# Altium footprint library lib_datalogger.PcbLib: 866 footprints (part 2 of 55)
Each footprint in its own frame and in the unit in brackets; x right, y up, seen from the top. Pads: shape width x height; smd on the part's side, far side on the other; paste and mask are expansions set on the pad; w line width, h text height; cw(c..) or ccw(c..) is an arc to the next point about the centre after c.
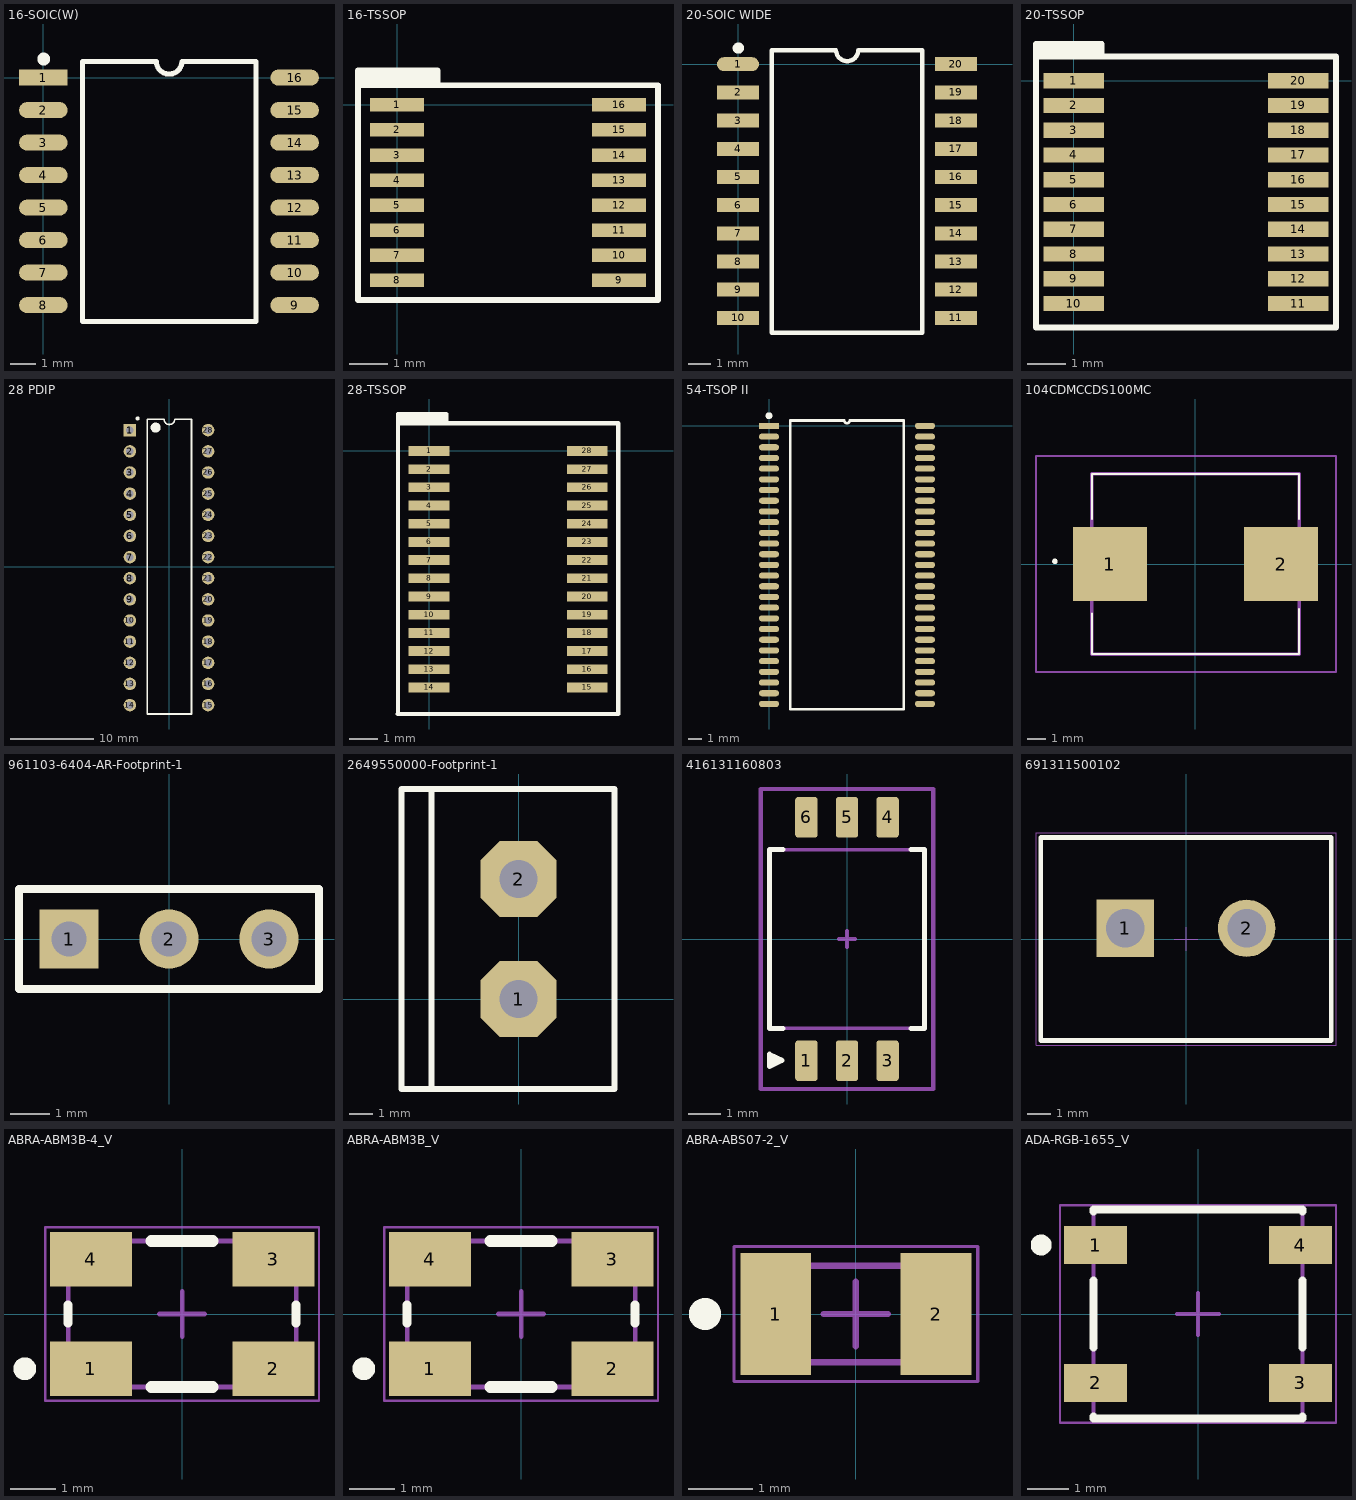
[diagram p1: the footprints below, top view; thin cyan lines are the x and y axes]

## 16-SOIC(W) [mm]
pads (16):
  rect 1.9x0.63 smd mask+0.076: 1(0,0)
  oval 1.9x0.63 smd mask+0.076: 2(0,-1.27) 3(0,-2.54) 4(0,-3.81) 5(0,-5.08) 6(0,-6.35) 7(0,-7.62) 8(0,-8.89) 9(9.82,-8.89) 10(9.82,-7.62) 11(9.82,-6.35) 12(9.82,-5.08) 13(9.82,-3.81) 14(9.82,-2.54) 15(9.82,-1.27) 16(9.82,0)
Top Overlay:
  circle w0.254: c0.015,0.724 r0.125
  lines w0.2: 1.524,-9.525 1.524,0.635 4.415,0.635 ccw(c4.915,0.635) 5.415,0.635 8.306,0.635 8.306,-9.525 1.524,-9.525
3D body "soic16w.step": height 1.7, standoff 0, extent -0.411,-9.398 10.231,0.508

## 16-TSSOP [mm]
pads (16):
  rect 1.4x0.35 smd: 1(0,0) 2(0,-0.65) 3(0,-1.3) 4(0,-1.95) 5(0,-2.6) 6(0,-3.25) 7(0,-3.9) 8(0,-4.55) 9(5.75,-4.55) 10(5.75,-3.9) 11(5.75,-3.25) 12(5.75,-2.6) 13(5.75,-1.95) 14(5.75,-1.3) 15(5.75,-0.65) 16(5.75,0)
Top Overlay:
  region: 1.041,0.508 1.041,0.889 -1.016,0.889 -1.016,0.508
  lines w0.152: -1.016,0.508 6.756,0.508 6.756,-5.055 -1.016,-5.055 -1.016,0.889 1.041,0.889 1.041,0.508
3D body "TSSOP-16-1.step": height 1.1, standoff 0, extent -0.33,-4.775 6.07,0.225

## 20-SOIC WIDE [mm]
pads (20):
  oval 1.9x0.63 smd mask+0.076: 1(0,0)
  rect 1.9x0.63 smd mask+0.076: 2(0,-1.27) 3(0,-2.54) 4(0,-3.81) 5(0,-5.08) 6(0,-6.35) 7(0,-7.62) 8(0,-8.89) 9(0,-10.16) 10(0,-11.43) 11(9.82,-11.43) 12(9.82,-10.16) 13(9.82,-8.89) 14(9.82,-7.62) 15(9.82,-6.35) 16(9.82,-5.08) 17(9.82,-3.81) 18(9.82,-2.54) 19(9.82,-1.27) 20(9.82,0)
Top Overlay:
  circle w0.254: c0.015,0.724 r0.125
  lines w0.2: 1.524,-12.09 1.524,0.635 4.415,0.635 ccw(c4.915,0.635) 5.415,0.635 8.306,0.635 8.306,-12.09 1.524,-12.09
3D body "20-SOIC-W.step": height 1.7, standoff 0, extent -0.406,-11.938 10.236,0.508

## 20-TSSOP [mm]
pads (20):
  rect 1.6x0.4 smd: 1(0,0) 2(0,-0.65) 3(0,-1.3) 4(0,-1.95) 5(0,-2.6) 6(0,-3.25) 7(0,-3.9) 8(0,-4.55) 9(0,-5.2) 10(0,-5.85) 11(5.893,-5.85) 12(5.893,-5.2) 13(5.893,-4.55) 14(5.893,-3.9) 15(5.893,-3.25) 16(5.893,-2.6) 17(5.893,-1.95) 18(5.893,-1.3) 19(5.893,-0.65) 20(5.893,0)
Top Overlay:
  region: -0.991,0.965 -0.991,0.635 0.737,0.635 0.737,0.965
  lines w0.152: 0.737,0.635 0.737,0.965 -0.991,0.965 -0.991,0.635 ; -0.991,0.635 -0.991,-6.477 6.883,-6.477 6.883,0.635 -0.991,0.635
3D body "tssop-20-1.step": height 1.2, standoff 0, extent -0.354,-6.221 6.246,0.379

## 28 PDIP [mm]
pads (28):
  rect 1.5x1.5 hole 0.9: 1(-4.699,16.383)
  round 1.5 hole 0.9: 2(-4.699,13.843) 3(-4.699,11.303) 4(-4.699,8.763) 5(-4.699,6.223) 6(-4.699,3.683) 7(-4.699,1.143) 8(-4.699,-1.397) 9(-4.699,-3.937) 10(-4.699,-6.477) 11(-4.699,-9.017) 12(-4.699,-11.557) 13(-4.699,-14.097) 14(-4.699,-16.637) 15(4.699,-16.637) 16(4.699,-14.097) 17(4.699,-11.557) 18(4.699,-9.017) 19(4.699,-6.477) 20(4.699,-3.937) 21(4.699,-1.397) 22(4.699,1.143) 23(4.699,3.683) 24(4.699,6.223) 25(4.699,8.763) 26(4.699,11.303) 27(4.699,13.843) 28(4.699,16.383)
Top Overlay:
  circle w0.6: c-1.605,16.692 r0.3
  circle w0.25: c-3.765,17.802 r0.125
  lines w0.2: -2.605,-17.708 2.695,-17.708 2.695,17.692 0.68,17.692 cw(c0.045,17.692) -0.59,17.692 -2.605,17.692 -2.605,-17.708
3D body "ATmega 48_88_168 28P3.STEP": height 5.54, standoff -1.59, extent -4.88,-17.526 4.88,17.124

## 28-TSSOP [mm]
pads (28):
  rect 1.45x0.35 smd: 1(0,0) 2(0,-0.65) 3(0,-1.3) 4(0,-1.95) 5(0,-2.6) 6(0,-3.25) 7(0,-3.9) 8(0,-4.55) 9(0,-5.2) 10(0,-5.85) 11(0,-6.5) 12(0,-7.15) 13(0,-7.8) 14(0,-8.45) 15(5.65,-8.45) 16(5.65,-7.8) 17(5.65,-7.15) 18(5.65,-6.5) 19(5.65,-5.85) 20(5.65,-5.2) 21(5.65,-4.55) 22(5.65,-3.9) 23(5.65,-3.25) 24(5.65,-2.6) 25(5.65,-1.95) 26(5.65,-1.3) 27(5.65,-0.65) 28(5.65,0)
Top Overlay:
  region: -1.112,1.321 -1.112,0.991 0.615,0.991 0.615,1.321
  lines w0.152: -1.118,-9.398 6.756,-9.398 ; -1.112,-9.398 -1.112,0.991 ; 0.615,0.991 0.615,1.321 -1.112,1.321 -1.112,0.991 ; 6.756,0.991 -1.112,0.991 ; 6.762,-9.398 6.762,0.991
3D body "tssop28.step": height 1.2, standoff 0, extent -0.375,-9.142 6.025,0.658

## 54-TSOP II [mm]
pads (54):
  rect 1.51x0.458 smd: 1(0,0)
  oval 1.51x0.458 smd: 2(0,-0.8) 3(0,-1.6) 4(0,-2.4) 5(0,-3.2) 6(0,-4) 7(0,-4.8) 8(0,-5.6) 9(0,-6.4) 10(0,-7.2) 11(0,-8) 12(0,-8.8) 13(0,-9.6) 14(0,-10.4) 15(0,-11.2) 16(0,-12) 17(0,-12.8) 18(0,-13.6) 19(0,-14.4) 20(0,-15.2) 21(0,-16) 22(0,-16.8) 23(0,-17.6) 24(0,-18.4) 25(0,-19.2) 26(0,-20) 27(0,-20.8) 28(11.67,-20.8) 29(11.67,-20) 30(11.67,-19.2) 31(11.67,-18.4) 32(11.67,-17.6) 33(11.67,-16.8) 34(11.67,-16) 35(11.67,-15.2) 36(11.67,-14.4) 37(11.67,-13.6) 38(11.67,-12.8) 39(11.67,-12) 40(11.67,-11.2) 41(11.67,-10.4) 42(11.67,-9.6) 43(11.67,-8.8) 44(11.67,-8) 45(11.67,-7.2) 46(11.67,-6.4) 47(11.67,-5.6) 48(11.67,-4.8) 49(11.67,-4) 50(11.67,-3.2) 51(11.67,-2.4) 52(11.67,-1.6) 53(11.67,-0.8) 54(11.67,0)
Top Overlay:
  circle w0.254: c0,0.762 r0.13
  lines w0.2: 1.59,-21.2 10.08,-21.2 10.08,0.4 6.035,0.4 cw(c5.835,0.4) 5.635,0.4 1.59,0.4 1.59,-21.2
3D body "TSOP-54-1.step": height 1.25, standoff 0, extent -0.045,-21.51 11.715,0.71

## 104CDMCCDS100MC [mm]
pads (2):
  rect 4.1x4.1 smd: 1(-4.75,0) 2(4.75,0)
Top Overlay:
  lines w0.1: -5.75,-5 -5.75,-2.75 -5.75,-5 ; -5.75,-5 5.75,-5 ; -5.75,-5 5.75,-5 ; -5.75,5 5.75,5 ; -5.75,5 5.75,5 ; -5.75,5 -5.75,2.5 -5.75,5 ; 5.75,-5 5.75,-2.5 5.75,-5 ; 5.75,5 5.75,2.5 5.75,5
  lines w0.2: -7.8,0.1 cw(c-7.8,0.15) -7.8,0.2 ; -7.8,0.1 ccw(c-7.8,0.15) -7.8,0.2 ; -7.8,0.1 cw(c-7.8,0.15) -7.8,0.2
Mechanical 13:
  lines w0.2: -5.75,-5 -5.75,5 5.75,5 5.75,-5 -5.75,-5
Mechanical 15:
  lines w0.1: -8.85,-6 -8.85,6 7.8,6 7.8,-6 -8.85,-6
3D body "104CDMCCDS-100MC.stp": height 4.1, standoff 0, extent -6.39,-5 6.39,5

## 961103-6404-AR-Footprint-1 [mm]
pads (3):
  rect 1.5x1.5 hole 0.9: 1(-2.54,0)
  round 1.5 hole 0.9: 2(0,0) 3(2.54,0)
Top Overlay:
  lines w0.2: -3.81,-1.27 -3.81,1.27 3.81,1.27 3.81,-1.27 -3.81,-1.27
3D body "User Library-Header_Male_3Pin.STEP": height 8.54, standoff -3, extent -3.81,-1.245 3.81,1.245

## 2649550000-Footprint-1 [mil]
pads (2):
  oct 126x126 hole 63: 1(0,0) 2(0,200)
Top Overlay:
  lines w10: -145,-150 -145,350 ; -195,-150 -195,350 160,350 160,-150 -195,-150
3D body "1924305.stp": height 472.44, standoff -153.54, extent -188.58,-139.37 150,339.37

## 416131160803 [mm] "03p, 1.27mm Pitch, Horizontal, HP Type, SMT, flat Actuator, black, with Tape, T&R"
height 3.3
pads (6):
  rrect25% 0.7x1.27 smd: 1(-1.27,-3.81) 2(0,-3.81) 3(1.27,-3.81) 4(1.27,3.81) 5(0,3.81) 6(-1.27,3.81)
Top Overlay:
  region: -2.025,-3.8 -2.425,-3.6 -2.425,-4
  region: -2.005,-3.8
  region: -2.005,-3.8
  lines w0.15: -2,-2.8 -2.425,-2.8 -2.425,2.8 -2,2.8 ; 2,-2.8 2.425,-2.8 2.425,2.8 2,2.8 ; -2.425,-4 -2.425,-3.6 -2.025,-3.8 -2.425,-4
Mechanical 13:
  lines w0.1: -2.413,-2.794 2.413,-2.794 2.413,2.794 -2.413,2.794 -2.413,-2.794
Mechanical 15:
  lines w0.127: -0.254,0 0.254,0 ; 0,-0.254 0,0.254 ; -2.7,-4.695 -2.7,4.695 2.7,4.695 2.7,-4.695 -2.7,-4.695
Top Designator:
  text ".Designator" at -1.27,-0.127 h0.6
3D body "416131160803.stp": height 2.06, standoff -0.04, extent -2.425,-4 2.425,4

## 691311500102 [mm] "5,08mm - PCB Headers - Vertical - Closed ends -02p"
height 12
pads (2):
  rect 2.4x2.4 hole 1.6: 1(-2.54,0.45)
  round 2.4 hole 1.6: 2(2.54,0.45)
Top Overlay:
  lines w0.2: -6.08,-4.25 -6.08,4.25 6.08,4.25 6.08,-4.25 -6.08,-4.25
Mechanical 13:
  lines w0.1: -6.08,-4.25 6.08,-4.25 6.08,4.25 -6.08,4.25 -6.08,-4.25
Mechanical 15:
  lines w0.05: -0.5,0 0.5,0 ; 0,-0.5 0,0.5 ; -6.28,-4.45 -6.28,4.45 6.28,4.45 6.28,-4.45 -6.28,-4.45
3D body "691311500102.stp": height 12.05, standoff -3.95, extent -6.08,-4.25 6.08,4.25

## ABRA-ABM3B-4_V [mm] "SMD, 4-Leads, Body 5x3.2mm"
height 1.1
pads (4):
  rect 1.8x1.2 smd: 1(-2,-1.2) 2(2,-1.2) 3(2,1.2) 4(-2,1.2)
Top Overlay:
  circle w0.25: c-3.45,-1.2 r0.125
  lines w0.2: -2.5,-0.2 -2.5,0.2 ; 2.5,-0.2 2.5,0.2
  lines w0.254: -0.673,-1.6 0.673,-1.6 ; -0.673,1.6 0.673,1.6
Mechanical 13:
  lines w0.1: -2.5,-1.6 -2.5,1.6 2.5,1.6 2.5,-1.6 -2.5,-1.6
Mechanical 15:
  lines w0.05: -3,-1.9 3,-1.9 3,1.9 -3,1.9 -3,-1.9
  lines w0.1: -0.5,0 0.5,0 ; 0,-0.5 0,0.5
3D body "ABM3B.STEP": height 1.13, standoff 0.01, extent -2.5,-1.587 2.5,1.588

## ABRA-ABM3B_V [mm] "SMD, 4-Leads, Body 5x3.2mm"
height 1.1
pads (4):
  rect 1.8x1.2 smd: 1(-2,-1.2) 2(2,-1.2) 3(2,1.2) 4(-2,1.2)
Top Overlay:
  circle w0.25: c-3.45,-1.2 r0.125
  lines w0.2: -2.5,-0.2 -2.5,0.2 ; 2.5,-0.2 2.5,0.2
  lines w0.254: -0.673,-1.6 0.673,-1.6 ; -0.673,1.6 0.673,1.6
Mechanical 13:
  lines w0.1: -2.5,-1.6 2.5,-1.6 2.5,1.6 -2.5,1.6 -2.5,-1.6
Mechanical 15:
  lines w0.05: -3,-1.9 -3,1.9 3,1.9 3,-1.9 -3,-1.9
  lines w0.1: -0.5,0 0.5,0 ; 0,-0.5 0,0.5
3D body "ABM3B.STEP": height 1.13, standoff 0.01, extent -2.5,-1.587 2.5,1.588

## ABRA-ABS07-2_V [mm] "SMD, 2-Leads, Body 3.2x1.5mm"
height 0.9
pads (2):
  rect 1.1x1.9 smd: 1(-1.25,0) 2(1.25,0)
Top Overlay:
  circle w0.25: c-2.35,0 r0.125
Mechanical 13:
  lines w0.1: -1.6,-0.75 -1.6,0.75 1.6,0.75 1.6,-0.75 -1.6,-0.75
Mechanical 15:
  lines w0.05: -1.9,-1.05 -1.9,1.05 1.9,1.05 1.9,-1.05 -1.9,-1.05
  lines w0.1: -0.5,0 0.5,0 ; 0,-0.5 0,0.5
3D body "ABS07.STEP": height 0.9, standoff 0.01, extent -1.6,-0.749 1.6,0.749

## ADA-RGB-1655_V [mm] "SMD, 4-Leads, Body 5x5mm"
pads (4):
  rect 1.5x0.9 smd: 1(-2.45,1.65) 2(-2.45,-1.65) 3(2.45,-1.65) 4(2.45,1.65)
Top Overlay:
  circle w0.25: c-3.75,1.65 r0.125
  lines w0.2: -2.5,-2.45 -2.5,-2.5 2.5,-2.5 2.5,-2.45 ; -2.5,-0.8 -2.5,0.8 ; -2.5,2.45 -2.5,2.5 2.5,2.5 2.5,2.45 ; 2.5,-0.8 2.5,0.8
Mechanical 13:
  lines w0.1: -2.5,-2.5 2.5,-2.5 2.5,2.5 -2.5,2.5 -2.5,-2.5
Mechanical 15:
  lines w0.05: -3.3,-2.6 -3.3,2.6 3.3,2.6 3.3,-2.6 -3.3,-2.6
  lines w0.1: -0.5,0 0.5,0 ; 0,-0.5 0,0.5
3D body "User Library-WS2812B.STEP": height 1.68, standoff -0.02, extent -2.7,-2.5 2.7,2.5